# Altium footprint library laihi.PcbLib: 222 footprints (part 6 of 14)
Each footprint in its own frame and in the unit in brackets; x right, y up, seen from the top. Pads: shape width x height; smd on the part's side, far side on the other; paste and mask are expansions set on the pad; w line width, h text height; cw(c..) or ccw(c..) is an arc to the next point about the centre after c.
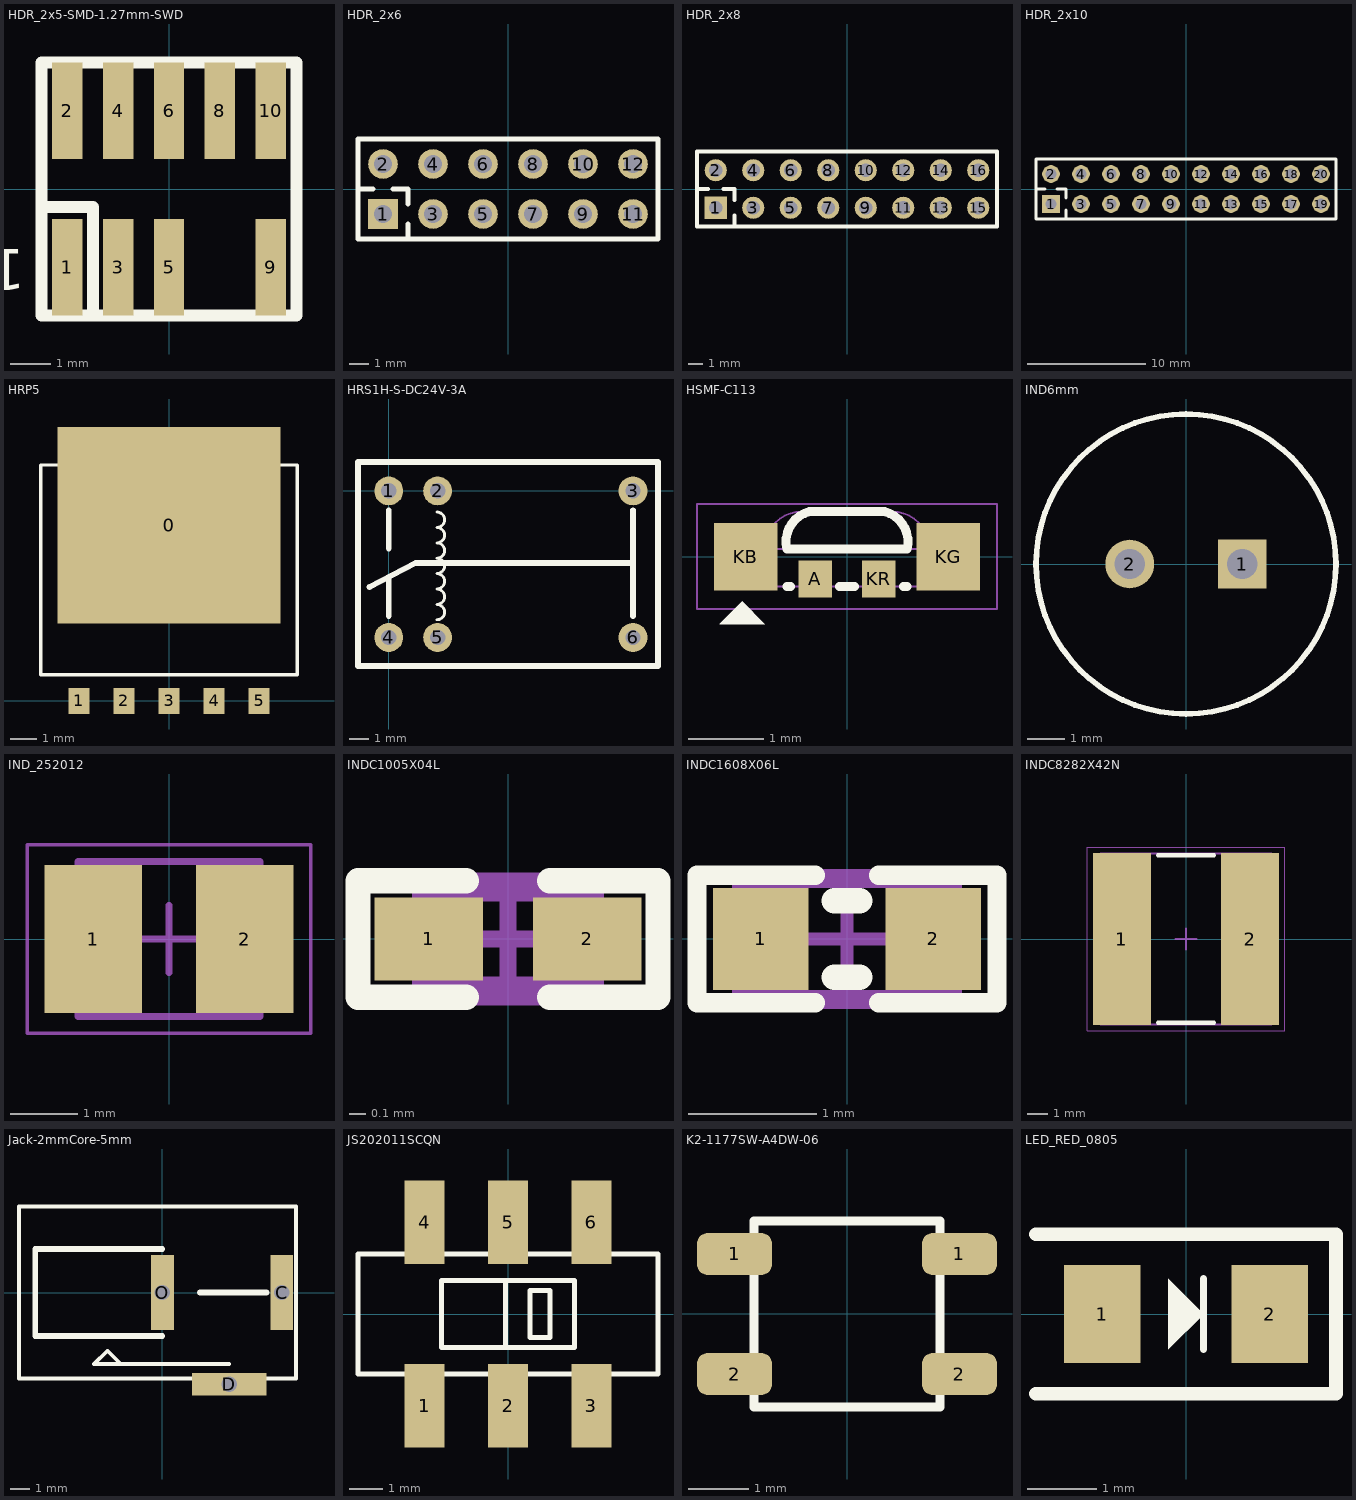
[diagram p5: the footprints below, top view; thin cyan lines are the x and y axes]

## HDR_2x5-SMD-1.27mm-SWD [mm]
pads (9):
  rect 0.76x2.4 smd: 1(-2.54,-1.95) 2(-2.54,1.95) 3(-1.27,-1.95) 4(-1.27,1.95) 5(0,-1.95) 6(0,1.95) 8(1.27,1.95) 9(2.54,-1.95) 10(2.54,1.95)
Top Overlay:
  lines w0.3: -3.175,-0.45 -1.9,-0.45 -1.9,-3.15 ; -3.175,-3.15 3.175,-3.15 3.175,3.15 -3.175,3.15 -3.175,-3.15
  text "1" at -3.581,-1.499 h1.02
3D body "Samtec-FTS-105-01-F-DV.step": height 4.33, standoff 0.01, extent -3.165,-2.921 3.185,2.921

## HDR_2x6 [mm] "Pin Header, 2.54mm through hole"
height 9.5
pads (12):
  rect 1.5x1.5 hole 0.9: 1(-6.35,-1.27)
  round 1.5 hole 0.9: 2(-6.35,1.27) 3(-3.81,-1.27) 4(-3.81,1.27) 5(-1.27,-1.27) 6(-1.27,1.27) 7(1.27,-1.27) 8(1.27,1.27) 9(3.81,-1.27) 10(3.81,1.27) 11(6.35,-1.27) 12(6.35,1.27)
Top Overlay:
  lines w0.254: -7.62,0 -6.858,0 ; -5.842,0 -5.08,0 -5.08,-0.762 ; -5.08,-2.54 -5.08,-1.778 ; -7.62,-2.54 -7.62,2.54 7.62,2.54 7.62,-2.54 -7.62,-2.54

## HDR_2x8 [mm] "Pin Header, 2.54mm through hole"
height 9.5
pads (16):
  rect 1.5x1.5 hole 0.9: 1(-8.89,-1.27)
  round 1.5 hole 0.9: 2(-8.89,1.27) 3(-6.35,-1.27) 4(-6.35,1.27) 5(-3.81,-1.27) 6(-3.81,1.27) 7(-1.27,-1.27) 8(-1.27,1.27) 9(1.27,-1.27) 10(1.27,1.27) 11(3.81,-1.27) 12(3.81,1.27) 13(6.35,-1.27) 14(6.35,1.27) 15(8.89,-1.27) 16(8.89,1.27)
Top Overlay:
  lines w0.254: -10.16,0 -9.398,0 ; -8.382,0 -7.62,0 -7.62,-0.762 ; -7.62,-2.54 -7.62,-1.778 ; -10.16,-2.54 10.16,-2.54 10.16,2.54 -10.16,2.54 -10.16,-2.54

## HDR_2x10 [mm] "Pin Header, 2.54mm through hole"
height 9.5
pads (20):
  rect 1.5x1.5 hole 0.9: 1(-11.43,-1.27)
  round 1.5 hole 0.9: 2(-11.43,1.27) 3(-8.89,-1.27) 4(-8.89,1.27) 5(-6.35,-1.27) 6(-6.35,1.27) 7(-3.81,-1.27) 8(-3.81,1.27) 9(-1.27,-1.27) 10(-1.27,1.27) 11(1.27,-1.27) 12(1.27,1.27) 13(3.81,-1.27) 14(3.81,1.27) 15(6.35,-1.27) 16(6.35,1.27) 17(8.89,-1.27) 18(8.89,1.27) 19(11.43,-1.27) 20(11.43,1.27)
Top Overlay:
  lines w0.254: -12.7,0 -11.938,0 ; -10.922,0 -10.16,0 -10.16,-0.762 ; -10.16,-2.54 -10.16,-1.778 ; -12.7,-2.54 -12.7,2.54 12.7,2.54 12.7,-2.54 -12.7,-2.54

## HRP5 [mm] "2A Fixed output LDO Rohm"
height 2
pads (6):
  rect 8.5x7.5 smd: 0(0,6.7)
  rect 0.8x1 smd: 1(-3.44,0) 2(-1.72,0) 3(0,0) 4(1.72,0) 5(3.44,0)
Top Overlay:
  lines w0.125: -4.9,1 -4.9,9 4.9,9 4.9,1 -4.9,1

## HRS1H-S-DC24V-3A [mm] "15.6mm x 10.6mm relay"
height 11.8
pads (6):
  round 1.5 hole 0.8: 1(0,0) 2(2.54,0) 3(12.7,0) 4(0,-7.62) 5(2.54,-7.62) 6(12.7,-7.62)
Top Overlay:
  lines w0.152: 2.5,-6.7 ccw(c2.5,-6.3) 2.5,-5.9 ccw(c2.5,-5.5) 2.5,-5.1 ccw(c2.5,-4.7) 2.5,-4.3 ccw(c2.5,-3.9) 2.5,-3.5 ccw(c2.5,-3.1) 2.5,-2.7 ccw(c2.5,-2.3) 2.5,-1.9 ccw(c2.5,-1.5) 2.5,-1.1
  lines w0.3: -1,-5 1.4,-3.75 12.7,-3.75 ; 0,-6.5 0,-4.5 ; 0,-3 0,-1 ; 12.7,-6.5 12.7,-1 ; -1.6,-9.1 14,-9.1 14,1.5 -1.6,1.5 -1.6,-9.1

## HSMF-C113 [mm] "OPTO LED TRI_COLOR RGB HSMF-C113"
height 1
pads (4):
  rect 0.45x0.5 smd: A(-0.425,-0.3) KR(0.425,-0.3)
  rect 0.85x0.9 smd: KB(-1.35,0) KG(1.35,0)
Top Overlay:
  region: -1.4,-0.6 -1.7,-0.9 -1.1,-0.9
  lines w0.12: -0.8,-0.4 -0.75,-0.4 ; -0.1,-0.4 0.1,-0.4 ; 0.75,-0.4 0.8,-0.4 ; -0.8,0.1 cw(c-0.4,0.2) -0.5,0.6 0.5,0.6 cw(c0.4,0.2) 0.8,0.1 -0.8,0.1
Mechanical 13:
  lines w0.025: -1.1,0.1 cw(c-0.6,0.1) -0.6,0.6 0.6,0.6 cw(c0.6,0.1) 1.1,0.1 ; -1.25,-0.4 1.25,-0.4 1.25,0.1 -1.25,0.1 -1.25,-0.4
Mechanical 15:
  lines w0.025: -2,-0.7 2,-0.7 2,-0.6 2,0.7 -2,0.7 -2,-0.7
3D body: height 1, standoff 0, extent -1.25,-0.4 1.25,0.1
3D body: height 0.9, standoff 0.1, extent -1.1,0.1 1.1,0.6
3D body: height 0.7, standoff 0.3, extent 0.402,0.301 0.8,0.699
3D body: height 0.7, standoff 0.3, extent -0.198,0.301 0.2,0.699
3D body: height 0.7, standoff 0.3, extent -0.797,0.301 -0.399,0.7

## IND6mm [mm] "Polarized Inductor (Radial); 2 Leads"
height 8
pads (2):
  rect 1.3x1.3 hole 0.8: 1(1.5,0)
  round 1.3 hole 0.8: 2(-1.5,0)
Top Overlay:
  circle w0.15: c0,0 r4

## IND_252012 [mm] "Molded Inductor, 2-Leads, Body 2.50x2.10mm, IPC Medium Density"
height 1.2
pads (2):
  rect 1.45x2.2 smd: 1(-1.125,0) 2(1.125,0)
Mechanical 13:
  lines w0.1: -1.35,-1.15 -1.35,1.15 1.35,1.15 1.35,-1.15 -1.35,-1.15
Mechanical 15:
  lines w0.05: -2.1,-1.4 -2.1,1.4 2.1,1.4 2.1,-1.4 -2.1,-1.4
  lines w0.1: -0.5,0 0.5,0 ; 0,-0.5 0,0.5
3D body "IND_252012.step": height 1.2, standoff 0, extent -1.57,-1.15 1.57,1.15

## INDC1005X04L [mm]
pads (2):
  rect 0.65x0.5 smd: 1(-0.475,0) 2(0.475,0)
Top Overlay:
  lines w0.152: -0.25,-0.35 -0.9,-0.35 -0.9,0.35 -0.25,0.35 ; 0.25,-0.35 0.9,-0.35 0.9,0.35 0.25,0.35
Mechanical 13:
  lines w0.1: -0.525,-0.275 -0.525,0.275 0.525,0.275 0.525,-0.275 -0.525,-0.275
Mechanical 15:
  lines w0.1: -0.275,0 0.275,0 ; 0,-0.275 0,0.275 ; -0.9,-0.35 -0.9,0.35 0.9,0.35 0.9,-0.35 -0.9,-0.35
3D body "User Library-Chip Inductor 0402.step": height 0.5, standoff 0, extent -0.5,-0.3 0.5,0.3

## INDC1608X06L [mm]
pads (2):
  rect 0.75x0.8 smd: 1(-0.675,0) 2(0.675,0)
Top Overlay:
  lines w0.152: -0.25,-0.5 -1.175,-0.5 -1.175,0.5 -0.25,0.5 ; 0.25,-0.5 1.175,-0.5 1.175,0.5 0.25,0.5
  lines w0.2: -0.1,-0.3 0.1,-0.3 ; -0.1,0.3 0.1,0.3
Mechanical 13:
  lines w0.1: -0.85,-0.45 0.85,-0.45 0.85,0.45 -0.85,0.45 -0.85,-0.45
Mechanical 15:
  lines w0.1: -0.45,0 0.45,0 ; 0,-0.45 0,0.45 ; -1.175,-0.5 -1.175,0.5 1.175,0.5 1.175,-0.5 -1.175,-0.5
3D body "User Library-Chip Inductor.step": height 0.8, standoff 0, extent -0.8,-0.475 0.8,0.475

## INDC8282X42N [mm] "Chip Inductor, 2-Leads, Body 8.15x8.15mm, IPC Medium Density"
height 4.2
pads (2):
  rect 2.82x8.33 smd: 1(-3.115,0) 2(3.115,0)
Top Overlay:
  lines w0.2: -1.35,-4.065 1.35,-4.065 ; -1.35,4.065 1.35,4.065
Mechanical 13:
  lines w0.1: -4.15,-4.15 -4.15,4.15 4.15,4.15 4.15,-4.15 -4.15,-4.15
Mechanical 15:
  lines w0.05: -4.8,-4.45 -4.8,4.45 4.8,4.45 4.8,-4.45 -4.8,-4.45
  lines w0.1: -0.5,0 0.5,0 ; 0,-0.5 0,0.5
3D body "INDC8282X42N.step": height 4.2, standoff 0, extent -4.15,-4.15 4.15,4.15

## Jack-2mmCore-5mm [mm] "5mm outer 2mm inner core jack"
height 11
pads (3):
  rect 1.2x3.9 hole 0.8 square: C(6.25,0) O(0,0)
  rect 3.9x1.2 hole 0.8 square: D(3.5,-4.8)
Top Overlay:
  lines w0.2: 3.5,-3.75 -2.175,-3.75 ; -3.575,-3.75 -2.175,-3.75 ; -3.575,-3.75 -3.575,-3.75 ; -3.575,-3.75 -2.875,-3.05 -2.175,-3.75 ; -7.5,-4.5 7,-4.5 7,4.5 -7.5,4.5 -7.5,-4.5
  lines w0.3: 0,-2.275 -6.65,-2.275 -6.65,2.275 0,2.275 ; 1.975,0 5.45,0
Mechanical 13:
  lines w0.025: -7.5,-4.5 -7.5,4.5 7,4.5 7,-4.5 -7.5,-4.5
Mechanical 15:
  lines w0.025: -7.5,-4.5 -7.5,4.5 7,4.5 7,-4.5 -7.5,-4.5
3D body: height 8.3, standoff 0, extent -7.5,-4.5 7,4.5

## JS202011SCQN [mm] "Slide Switches - DPDT, SMD, ON-ON"
height 3.5
pads (6):
  rect 1.2x2.5 smd: 1(-2.5,-2.75) 2(0,-2.75) 3(2.5,-2.75) 4(-2.5,2.75) 5(0,2.75) 6(2.5,2.75)
Top Overlay:
  lines w0.152: -0.08,-1 -0.08,1 ; 1.24,0.7 0.66,0.7 0.66,-0.7 1.26,-0.7 1.26,0.7 ; -4.5,-1.8 4.5,-1.8 4.5,1.8 -4.5,1.8 -4.5,-1.8 ; -2,-1 2,-1 2,1 -2,1 -2,-1
3D body: height 3.48, standoff 3, extent -2,1 2,1.8
3D body: height 3.48, standoff 3, extent -2,-1.8 2,-1
3D body: height 3.48, standoff 3, extent 2,-1.8 4.5,1.8
3D body: height 3.5, standoff 3.48, extent 2,-1 4.5,1
3D body: height 3.5, standoff 3.48, extent -4.5,-1.8 4.5,-1
3D body: height 3.5, standoff 3.48, extent -4.5,-1 -2,1
3D body: height 0.9, standoff 0, extent 2.2,-1.825 2.8,-1.675
3D body: height 0.15, standoff 0, extent 2.2,-3.75 2.8,-1.8
3D body: height 0.15, standoff 0, extent -0.3,-3.75 0.3,-1.8
3D body: height 0.9, standoff 0, extent -0.3,-1.825 0.3,-1.675
3D body: height 0.15, standoff 0, extent -2.8,-3.75 -2.2,-1.8
3D body: height 0.9, standoff 0, extent -2.8,-1.825 -2.2,-1.675
3D body: height 0.15, standoff 0, extent -4.2,1.2 -3.9,1.5
3D body: height 0.15, standoff 0, extent 3.9,1.2 4.2,1.5
3D body: height 0.15, standoff 0, extent 3.9,-1.5 4.2,-1.2
3D body: height 0.15, standoff 0, extent -4.2,-1.5 -3.9,-1.2
3D body: height 3, standoff 0.9, extent -4.5,-1.8 4.5,1.8
3D body: height 3.05, standoff 3, extent -2,-1 2,1
3D body: height 5.5, standoff 1.75, extent -0.08,-1 2,1
3D body: height 3.48, standoff 3, extent -4.5,-1.8 -2,1.8
3D body: height 3.5, standoff 2.63, extent 4.5,-1.2 4.52,1.2
3D body: height 2.63, standoff 1.75, extent 4.5,-1.7 4.52,1.7
3D body: height 2.63, standoff 1.75, extent -4.52,-1.7 -4.5,1.7
3D body: height 3.5, standoff 2.63, extent -4.52,-1.2 -4.5,1.2
3D body: height 0.9, standoff 0, extent 2.2,1.675 2.8,1.825
3D body: height 0.15, standoff 0, extent 2.2,1.8 2.8,3.75
3D body: height 0.9, standoff 0, extent -0.3,1.675 0.3,1.825
3D body: height 0.15, standoff 0, extent -0.3,1.8 0.3,3.75
3D body: height 3.5, standoff 3.48, extent -4.5,1 4.5,1.8
3D body: height 0.15, standoff 0, extent -2.8,1.8 -2.2,3.75
3D body: height 0.9, standoff 0, extent -2.8,1.675 -2.2,1.825
3D body: height 0.9, standoff 0.15, extent -4.3,-1.6 4.3,1.675

## K2-1177SW-A4DW-06 [mm] "90 degree press switch"
height 1.5
pads (4):
  rrect50% 1.25x0.7 smd: 1(-1.875,1) 1(1.875,1) 2(-1.875,-1) 2(1.875,-1)
Top Overlay:
  lines w0.152: -1.55,-1.55 -1.55,1.55 1.55,1.55 1.55,-1.55 -1.55,-1.55
3D body: height 6, standoff 0, extent -1.55,-1.55 1.55,1.55

## LED_RED_0805 [mm]
height 1.1
pads (2):
  rect 1.1x1.4 smd: 1(-1.2,0) 2(1.2,0)
Top Overlay:
  region: -0.254,0.508 -0.254,-0.508 0.254,0
  lines w0.1: 0.254,-0.508 0.254,0.508
  lines w0.2: -2.15,-1.143 2.15,-1.143 2.15,1.143 -2.15,1.143